# Altium footprint library Basal.PcbLib: 248 footprints (part 3 of 16)
Each footprint in its own frame and in the unit in brackets; x right, y up, seen from the top. Pads: shape width x height; smd on the part's side, far side on the other; paste and mask are expansions set on the pad; w line width, h text height; cw(c..) or ccw(c..) is an arc to the next point about the centre after c.
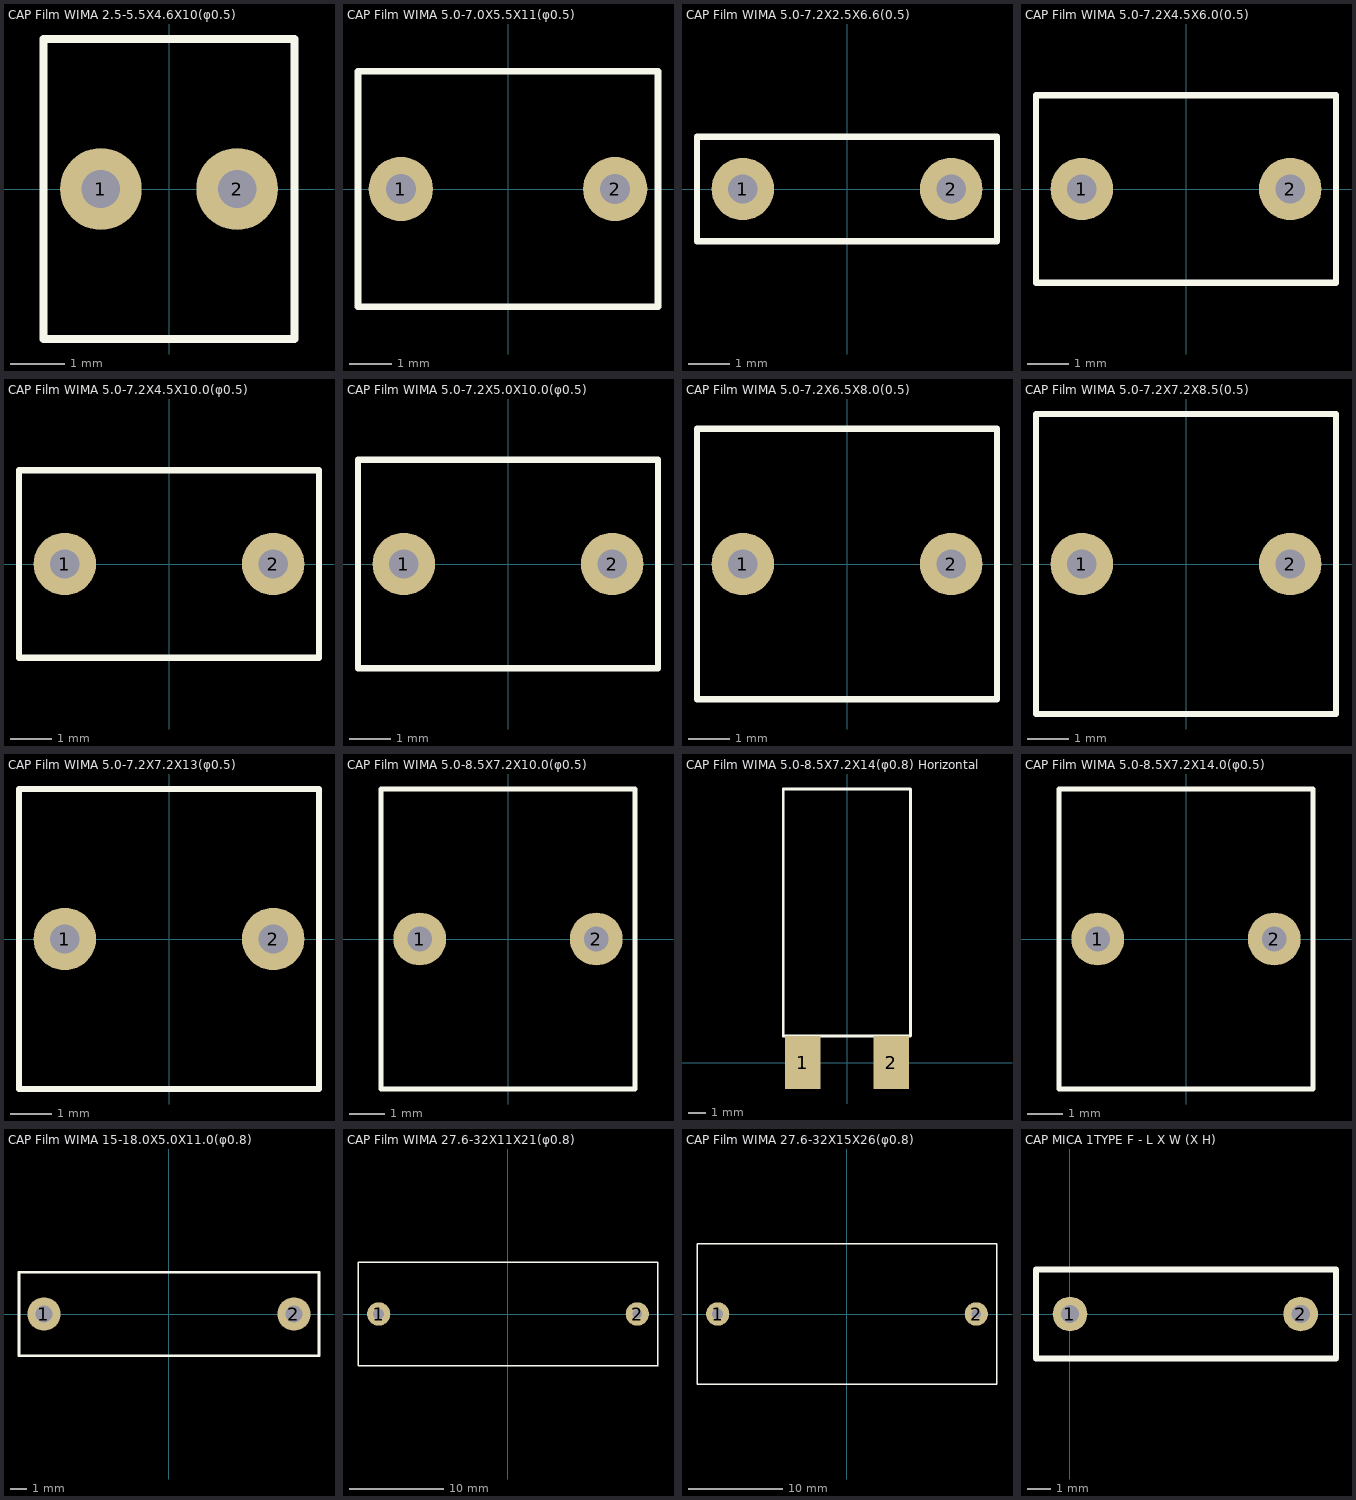
[diagram p2: the footprints below, top view; thin cyan lines are the x and y axes]

## CAP Film WIMA 2.5-5.5X4.6X10(φ0.5) [mm]
pads (2):
  round 1.5 hole 0.7: 1(-1.25,0) 2(1.25,0)
Top Overlay:
  lines w0.152: -2.3,-2.75 -2.3,2.75 2.3,2.75 2.3,-2.75 -2.3,-2.75
3D body "2.5-5.5 x 4.6 x 10(0.5).STEP": height 10.05, standoff -2.45, extent -2.3,-2.75 2.3,2.75

## CAP Film WIMA 5.0-7.0X5.5X11(φ0.5) [mm]
pads (2):
  round 1.5 hole 0.7: 1(-2.5,0) 2(2.5,0)
Top Overlay:
  lines w0.152: -3.5,-2.75 -3.5,2.75 3.5,2.75 3.5,-2.75 -3.5,-2.75
3D body "5.0-7.0 x 5.0 x 11(0.9).STEP": height 11, standoff -4, extent -3.5,-2.726 3.5,2.794

## CAP Film WIMA 5.0-7.2X2.5X6.6(0.5) [mm]
pads (2):
  round 1.5 hole 0.7: 1(-2.5,0) 2(2.5,0)
Top Overlay:
  lines w0.152: -3.6,-1.25 3.6,-1.25 3.6,1.25 -3.6,1.25 -3.6,-1.25

## CAP Film WIMA 5.0-7.2X4.5X6.0(0.5) [mm]
pads (2):
  round 1.5 hole 0.7: 1(-2.5,0) 2(2.5,0)
Top Overlay:
  lines w0.152: -3.6,-2.25 3.6,-2.25 3.6,2.25 -3.6,2.25 -3.6,-2.25

## CAP Film WIMA 5.0-7.2X4.5X10.0(φ0.5) [mm]
pads (2):
  round 1.5 hole 0.7: 1(-2.5,0) 2(2.5,0)
Top Overlay:
  lines w0.152: -3.6,-2.25 -3.6,2.25 3.6,2.25 3.6,-2.25 -3.6,-2.25
3D body "5.0-7.2 x 4.5 x 6.0(0.5).STEP": height 6.05, standoff -3.95, extent -3.6,-2.25 3.6,2.26
3D body "5.0-7.2 x 4.5 x 6.0(0.5).STEP": height 10, standoff 0, extent -3.6,-2.26 3.6,2.25

## CAP Film WIMA 5.0-7.2X5.0X10.0(φ0.5) [mm]
pads (2):
  round 1.5 hole 0.7: 1(-2.5,0) 2(2.5,0)
Top Overlay:
  lines w0.152: 3.596,2.5 3.6,2.496 3.6,-2.5 -3.6,-2.5 -3.6,2.5 3.6,2.5
3D body: height 10, standoff 0, extent -3.607,-2.515 3.607,2.489

## CAP Film WIMA 5.0-7.2X6.5X8.0(0.5) [mm]
pads (2):
  round 1.5 hole 0.7: 1(-2.5,0) 2(2.5,0)
Top Overlay:
  lines w0.152: -3.6,-3.25 3.6,-3.25 3.6,3.25 -3.6,3.25 -3.6,-3.25

## CAP Film WIMA 5.0-7.2X7.2X8.5(0.5) [mm]
pads (2):
  round 1.5 hole 0.7: 1(-2.5,0) 2(2.5,0)
Top Overlay:
  lines w0.152: -3.6,-3.6 -3.6,3.6 3.6,3.6 3.6,-3.6 -3.6,-3.6

## CAP Film WIMA 5.0-7.2X7.2X13(φ0.5) [mm]
pads (2):
  round 1.5 hole 0.7: 1(-2.5,0) 2(2.5,0)
Top Overlay:
  lines w0.152: -3.6,-3.6 3.6,-3.6 3.6,3.6 -3.6,3.6 -3.6,-3.6
3D body "5.0-7.2 x 7.2 x 8.5(0.5).STEP": height 14.05, standoff 3.05, extent -3.6,-3.6 3.6,3.6
3D body "5.0-7.2 x 7.2 x 8.5(0.5).STEP": height 8.55, standoff -2.45, extent -3.6,-3.6 3.6,3.6

## CAP Film WIMA 5.0-8.5X7.2X10.0(φ0.5) [mm]
pads (2):
  round 1.5 hole 0.7: 1(-2.5,0) 2(2.5,0)
Top Overlay:
  lines w0.152: 3.6,4.25 -3.6,4.25 -3.6,-4.25 3.6,-4.25 3.6,4.25
3D body "5.0-8.5 x 7.2 x 10.0(0.5).STEP": height 10.05, standoff -2.45, extent -3.6,-4.25 3.6,4.25

## CAP Film WIMA 5.0-8.5X7.2X14(φ0.8) Horizontal [mm]
pads (2):
  rect 2x3 smd: 1(-2.5,0) 2(2.5,0)
Top Overlay:
  lines w0.152: -3.618,1.5 3.596,1.5 3.596,15.5 -3.618,15.5 -3.618,1.5
3D body "CAPRR500W50L720T720H850_WIMA_1J.STEP": height 7.2, standoff 0, extent -3.6,4.5 3.6,15.5
3D body "CAPRR500W50L720T720H850_WIMA_1J.STEP": height 7.2, standoff 0, extent -3.6,-0.947 3.6,10.054

## CAP Film WIMA 5.0-8.5X7.2X14.0(φ0.5) [mm]
pads (2):
  round 1.5 hole 0.7: 1(-2.5,0) 2(2.5,0)
Top Overlay:
  lines w0.152: 3.6,4.25 -3.6,4.25 -3.6,-4.25 3.6,-4.25 3.6,4.25
3D body "5.0-8.5 x 7.2 x 10.0(0.5).STEP": height 14.05, standoff 1.55, extent -3.6,-4.25 3.6,4.25
3D body "5.0-8.5 x 7.2 x 10.0(0.5).STEP": height 10.05, standoff -2.45, extent -3.6,-4.25 3.6,4.25

## CAP Film WIMA 15-18.0X5.0X11.0(φ0.8) [mm]
pads (2):
  round 2 hole 1: 1(-7.5,0) 2(7.5,0)
Top Overlay:
  lines w0.152: -9,-2.5 9,-2.5 ; -9,2.5 9,2.5 9,-2.5 ; -9,-2.5 -9,2.5
3D body "User Library-CAPRR1500W80L1800T500H1100_WIMA_4B.STEP": height 11.05, standoff -2.45, extent -9,-2.5 9,2.5

## CAP Film WIMA 27.6-32X11X21(φ0.8) [mm]
pads (2):
  round 2.5 hole 1.2: 1(-13.8,0)
  round 2.5 hole 1: 2(13.8,0)
Top Overlay:
  lines w0.152: -16,-5.5 16,-5.5 16,5.5 -16,5.5 -16,-5.5
3D body: height 21, standoff 0, extent -16,-5.5 16,5.5
3D body: height 3, standoff -1, extent -14.2,-0.399 -13.4,0.4
3D body: height 3, standoff -1, extent 13.4,-0.399 14.2,0.4

## CAP Film WIMA 27.6-32X15X26(φ0.8) [mm]
pads (2):
  round 2.5 hole 1.2: 1(-13.8,0)
  round 2.5 hole 1: 2(13.8,0)
Top Overlay:
  lines w0.152: -16,-7.5 16,-7.5 16,7.5 -16,7.5 -16,-7.5
3D body: height 26, standoff 0, extent -15.937,-7.468 15.991,7.442
3D body: height 3, standoff -1, extent 13.4,-0.399 14.2,0.4
3D body: height 3, standoff -1, extent -14.2,-0.399 -13.4,0.4

## CAP MICA 1TYPE F - L X W (X H) [mm]
pads (2):
  round 1.5 hole 0.8: 1(0,0) 2(10,0)
Top Overlay:
  lines w0.254: -1.473,-1.93 -1.473,1.93 11.532,1.93 11.532,-1.93 -1.473,-1.93